# Altium footprint library SparkFun-Retired.PCBLIB: 302 footprints (part 10 of 19)
Each footprint in its own frame and in the unit in brackets; x right, y up, seen from the top. Pads: shape width x height; smd on the part's side, far side on the other; paste and mask are expansions set on the pad; w line width, h text height; cw(c..) or ccw(c..) is an arc to the next point about the centre after c.
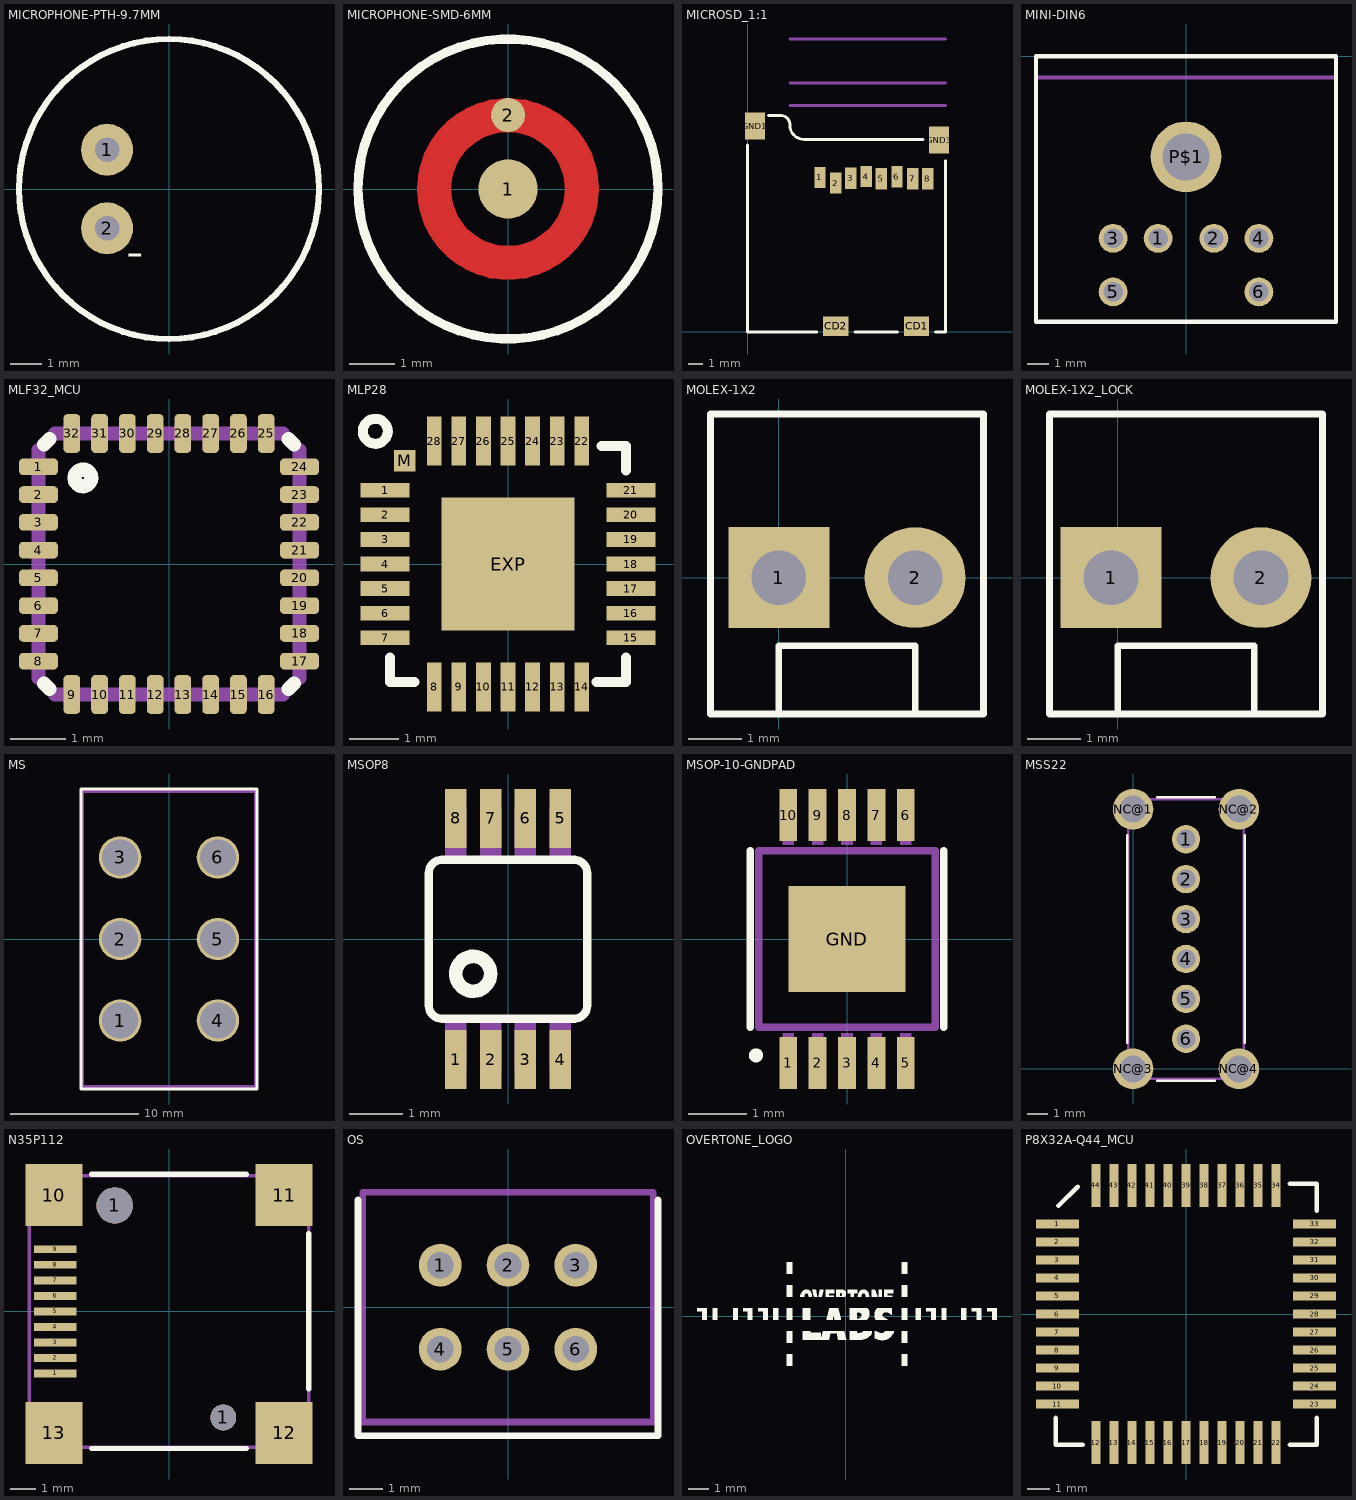
[diagram p9: the footprints below, top view; thin cyan lines are the x and y axes]

## MICROPHONE-PTH-9.7MM [mil]
pads (2):
  round 66 hole 31.5: 1(-78.74,50) 2(-78.74,-50)
Top Overlay:
  circle w8: c0,0 r190.94
  text "-" at -54.57,-115.35 h77.5
Bottom Overlay:
  text "-" at -20.24,-115.35 h77.5

## MICROPHONE-SMD-6MM [mil]
pads (2):
  rrect100% 51.18x51.18 smd: 1(0,0)
  rrect100% 29.53x29.53 smd: 2(0.12,64.03)
Top Layer:
  circle w29.53: c0,0 r63.98
Top Overlay:
  circle w8: c0,0 r129.92
Top Paste:
  circle w12: c0,0 r64.26
  circle w16: c0,0 r6.01
Top Solder:
  circle w38: c0,0 r64.07

## MICROSD_1:1 [mil]
pads (12):
  rect 31.5x59.06 smd: 1(200.62,429.89) 2(244.79,414.15) 3(286.37,427.3) 4(329.39,432.37) 5(370.9,426.3) 6(414.93,432.01) 7(458.59,425.94) 8(500.82,425.94)
  rect 70.87x55.12 smd: CD1(469.29,15.75) CD2(244.88,15.75)
  rect 55.12x74.8 smd: GND1(19.57,572.83) GND3(532.28,533.46)
Top Overlay:
  lines w8: -1.18,519.69 -1.18,0 191.73,0 ; 57.87,602.36 89.37,602.36 cw(c91.34,576.77) 116.93,574.8 ccw(c157.28,575.78) 156.3,535.43 487.01,535.43 ; 298.03,0 416.14,0 ; 522.44,0 550,0 550,476.38
Mechanical 16:
  lines w8: 116.93,629.92 550,629.92 ; 116.93,692.91 550,692.91 ; 116.93,814.96 550,814.96

## MINI-DIN6 [mm]
pads (7):
  round 1.35 hole 0.9: 1(-1.3,-8.5) 2(1.3,-8.5) 3(-3.4,-8.5) 4(3.4,-8.5) 5(-3.4,-11) 6(3.4,-11)
  round 3.3 hole 2.2: P$1(0,-4.7)
Top Overlay:
  lines w0.203: -7,-12.4 -7,0 7,0 7,-12.4 -7,-12.4
Mechanical 16:
  lines w0.203: -7,-1 7,-1

## MLF32_MCU [mm]
pads (32):
  rrect50% 0.7x0.3 smd: 1(-2.35,1.75) 2(-2.35,1.25) 3(-2.35,0.75) 4(-2.35,0.25) 5(-2.35,-0.25) 6(-2.35,-0.75) 7(-2.35,-1.25) 8(-2.35,-1.75) 17(2.35,-1.75) 18(2.35,-1.25) 19(2.35,-0.75) 20(2.35,-0.25) 21(2.35,0.25) 22(2.35,0.75) 23(2.35,1.25) 24(2.35,1.75)
  rrect50% 0.3x0.7 smd: 9(-1.75,-2.35) 10(-1.25,-2.35) 11(-0.75,-2.35) 12(-0.25,-2.35) 13(0.25,-2.35) 14(0.75,-2.35) 15(1.25,-2.35) 16(1.75,-2.35) 25(1.75,2.35) 26(1.25,2.35) 27(0.75,2.35) 28(0.25,2.35) 29(-0.25,2.35) 30(-0.75,2.35) 31(-1.25,2.35) 32(-1.75,2.35)
Top Overlay:
  circle w0.254: c-1.55,1.55 r0.15
  lines w0.254: -2.25,-2.15 -2.15,-2.25 ; -2.25,2.15 -2.15,2.25 ; 2.15,-2.25 2.25,-2.15 ; 2.15,2.25 2.25,2.15
Mechanical 16:
  rectangle: -2.5,1.6 -2.05,1.9
  rectangle: -2.5,1.1 -2.05,1.4
  rectangle: -2.5,0.6 -2.05,0.9
  rectangle: -2.5,0.1 -2.05,0.4
  rectangle: -2.5,-0.4 -2.05,-0.1
  rectangle: -2.5,-0.9 -2.05,-0.6
  rectangle: -2.5,-1.4 -2.05,-1.1
  rectangle: -2.5,-1.9 -2.05,-1.6
  rectangle: -1.9,-2.5 -1.6,-2.05
  rectangle: -1.4,-2.5 -1.1,-2.05
  rectangle: -0.9,-2.5 -0.6,-2.05
  rectangle: -0.4,-2.5 -0.1,-2.05
  rectangle: 0.1,-2.5 0.4,-2.05
  rectangle: 0.6,-2.5 0.9,-2.05
  rectangle: 1.1,-2.5 1.4,-2.05
  rectangle: 1.6,-2.5 1.9,-2.05
  rectangle: 2.05,-1.9 2.5,-1.6
  rectangle: 2.05,-1.4 2.5,-1.1
  rectangle: 2.05,-0.9 2.5,-0.6
  rectangle: 2.05,-0.4 2.5,-0.1
  rectangle: 2.05,0.1 2.5,0.4
  rectangle: 2.05,0.6 2.5,0.9
  rectangle: 2.05,1.1 2.5,1.4
  rectangle: 2.05,1.6 2.5,1.9
  rectangle: 1.6,2.05 1.9,2.5
  rectangle: 1.1,2.05 1.4,2.5
  rectangle: 0.6,2.05 0.9,2.5
  rectangle: 0.1,2.05 0.4,2.5
  rectangle: -0.4,2.05 -0.1,2.5
  rectangle: -0.9,2.05 -0.6,2.5
  rectangle: -1.4,2.05 -1.1,2.5
  rectangle: -1.9,2.05 -1.6,2.5
  lines w0.254: -2.35,-2.05 -2.35,2.05 ; -2.05,-2.35 2.05,-2.35 ; -2.05,2.35 2.05,2.35 ; 2.35,-2.05 2.35,2.05

## MLP28 [mm]
pads (30):
  rect 1x0.3 smd: 1(-2.5,1.5) 2(-2.5,1) 3(-2.5,0.5) 4(-2.5,0) 5(-2.5,-0.5) 6(-2.5,-1) 7(-2.5,-1.5) 15(2.5,-1.5) 16(2.5,-1) 17(2.5,-0.5) 18(2.5,0) 19(2.5,0.5) 20(2.5,1) 21(2.5,1.5)
  rect 0.3x1 smd: 8(-1.5,-2.5) 9(-1,-2.5) 10(-0.5,-2.5) 11(0,-2.5) 12(0.5,-2.5) 13(1,-2.5) 14(1.5,-2.5) 22(1.5,2.5) 23(1,2.5) 24(0.5,2.5) 25(0,2.5) 26(-0.5,2.5) 27(-1,2.5) 28(-1.5,2.5)
  rect 2.7x2.7 smd: EXP(0,0)
  rect 0.435x0.435 smd: M(-2.103,2.103)
Top Overlay:
  circle w0.203: c-2.699,2.699 r0.254
  lines w0.203: -2.4,-1.9 -2.4,-2.4 -1.9,-2.4 ; 1.8,-2.4 2.4,-2.4 2.4,-1.9 ; 1.9,2.4 2.4,2.4 2.4,1.9
Top Paste:
  rectangle: -2.58,1.37 -2.02,1.63
  rectangle: -0.5,-0.5 0.5,0.5
  rectangle: -2.25,1.95 -1.95,2.25
  rectangle: -2.58,0.87 -2.02,1.13
  rectangle: -2.58,0.37 -2.02,0.63
  rectangle: -2.58,-0.13 -2.02,0.13
  rectangle: -2.58,-0.63 -2.02,-0.37
  rectangle: -2.58,-1.13 -2.02,-0.87
  rectangle: -2.58,-1.63 -2.02,-1.37
  region: 1.37,2.58 1.37,2.02 1.63,2.02 1.63,2.58
  region: 0.87,2.58 0.87,2.02 1.13,2.02 1.13,2.58
  region: 0.37,2.58 0.37,2.02 0.63,2.02 0.63,2.58
  region: -0.13,2.58 -0.13,2.02 0.13,2.02 0.13,2.58
  region: -0.63,2.58 -0.63,2.02 -0.37,2.02 -0.37,2.58
  region: -1.13,2.58 -1.13,2.02 -0.87,2.02 -0.87,2.58
  region: -1.63,2.58 -1.63,2.02 -1.37,2.02 -1.37,2.58
  region: -1.37,-2.58 -1.37,-2.02 -1.63,-2.02 -1.63,-2.58
  region: -0.87,-2.58 -0.87,-2.02 -1.13,-2.02 -1.13,-2.58
  region: -0.37,-2.58 -0.37,-2.02 -0.63,-2.02 -0.63,-2.58
  region: 0.13,-2.58 0.13,-2.02 -0.13,-2.02 -0.13,-2.58
  region: 0.63,-2.58 0.63,-2.02 0.37,-2.02 0.37,-2.58
  region: 1.13,-2.58 1.13,-2.02 0.87,-2.02 0.87,-2.58
  region: 1.63,-2.58 1.63,-2.02 1.37,-2.02 1.37,-2.58
  region: 2.58,-1.37 2.02,-1.37 2.02,-1.63 2.58,-1.63
  region: 2.58,-0.87 2.02,-0.87 2.02,-1.13 2.58,-1.13
  region: 2.58,-0.37 2.02,-0.37 2.02,-0.63 2.58,-0.63
  region: 2.58,0.13 2.02,0.13 2.02,-0.13 2.58,-0.13
  region: 2.58,0.63 2.02,0.63 2.02,0.37 2.58,0.37
  region: 2.58,1.13 2.02,1.13 2.02,0.87 2.58,0.87
  region: 2.58,1.63 2.02,1.63 2.02,1.37 2.58,1.37
Top Solder:
  rectangle: -3.05,1.3 -2,1.7
  rectangle: -2.353,1.852 -1.852,2.353
  rectangle: -3.05,0.8 -2,1.2
  rectangle: -1.5,-1.5 1.5,1.5
  rectangle: -3.05,0.3 -2,0.7
  rectangle: -3.05,-0.2 -2,0.2
  rectangle: -3.05,-0.7 -2,-0.3
  rectangle: -3.05,-1.2 -2,-0.8
  rectangle: -3.05,-1.7 -2,-1.3
  region: 1.3,3.05 1.3,2 1.7,2 1.7,3.05
  region: 0.8,3.05 0.8,2 1.2,2 1.2,3.05
  region: 0.3,3.05 0.3,2 0.7,2 0.7,3.05
  region: -0.2,3.05 -0.2,2 0.2,2 0.2,3.05
  region: -0.7,3.05 -0.7,2 -0.3,2 -0.3,3.05
  region: -1.2,3.05 -1.2,2 -0.8,2 -0.8,3.05
  region: -1.7,3.05 -1.7,2 -1.3,2 -1.3,3.05
  region: -1.3,-3.05 -1.3,-2 -1.7,-2 -1.7,-3.05
  region: -0.8,-3.05 -0.8,-2 -1.2,-2 -1.2,-3.05
  region: -0.3,-3.05 -0.3,-2 -0.7,-2 -0.7,-3.05
  region: 0.2,-3.05 0.2,-2 -0.2,-2 -0.2,-3.05
  region: 0.7,-3.05 0.7,-2 0.3,-2 0.3,-3.05
  region: 1.2,-3.05 1.2,-2 0.8,-2 0.8,-3.05
  region: 1.7,-3.05 1.7,-2 1.3,-2 1.3,-3.05
  region: 3.05,-1.3 2,-1.3 2,-1.7 3.05,-1.7
  region: 3.05,-0.8 2,-0.8 2,-1.2 3.05,-1.2
  region: 3.05,-0.3 2,-0.3 2,-0.7 3.05,-0.7
  region: 3.05,0.2 2,0.2 2,-0.2 3.05,-0.2
  region: 3.05,0.7 2,0.7 2,0.3 3.05,0.3
  region: 3.05,1.2 2,1.2 2,0.8 3.05,0.8
  region: 3.05,1.7 2,1.7 2,1.3 3.05,1.3

## MOLEX-1X2 [mil]
pads (2):
  rect 74x74 hole 40: 1(0,0)
  round 74 hole 40: 2(100,0)
Top Overlay:
  lines w5: 0,-100 100,-100 ; 0,-100 -50,-100 -50,120 150,120 150,-100 100,-100 ; 0,-100 0,-50 100,-50 100,-100

## MOLEX-1X2_LOCK [mil]
pads (2):
  rect 74x74 hole 40: 1(-5,0)
  round 74 hole 40: 2(105,0)
Top Overlay:
  lines w5: 0,-100 100,-100 ; 0,-100 -50,-100 -50,120 150,120 150,-100 100,-100 ; 0,-100 0,-50 100,-50 100,-100
Mechanical 16:
  rectangle: -11.5,-11.5 11.5,11.5
  rectangle: 88.5,-11.5 111.5,11.5

## MS [mil]
pads (6):
  round 130 hole 110.24: 1(-150,-250) 2(-150,0) 3(-150,250) 4(150,-250) 5(150,0) 6(150,250)
Top Overlay:
  lines w8: -270,-460 -270,460 270,460 270,-460 -270,-460
Mechanical 16:
  lines w8: -265,-452.5 265,-452.5 265,452.5 -265,452.5 -265,-452.5

## MSOP8 [mil]
pads (8):
  rect 15.75x43.31 smd: 1(-38.39,-88.58) 2(-12.8,-88.58) 3(12.8,-88.58) 4(38.39,-88.58) 5(38.39,88.58) 6(12.8,88.58) 7(-12.8,88.58) 8(-38.39,88.58)
Top Overlay:
  circle w10: c-25.59,-25.59 r12.8
  lines w6: -58.27,-48.82 ccw(c-48.43,-48.82) -48.43,-58.66 ; -58.27,-48.43 -58.27,48.43 cw(c-48.43,48.43) -48.43,58.27 ; -48.03,-58.66 48.82,-58.66 ; -48.03,58.27 48.82,58.27 ; 48.43,-58.66 ccw(c48.43,-48.82) 58.27,-48.82 58.27,48.43 ccw(c48.43,48.43) 48.43,58.27
Mechanical 16:
  rectangle: -46.26,-96.46 -30.51,-61.02
  rectangle: -20.67,-96.46 -4.92,-61.02
  rectangle: 4.92,-96.46 20.67,-61.02
  rectangle: 30.51,-96.46 46.26,-61.02
  rectangle: 30.51,61.02 46.26,96.46
  rectangle: 4.92,61.02 20.67,96.46
  rectangle: -20.67,61.02 -4.92,96.46
  rectangle: -46.26,61.02 -30.51,96.46

## MSOP-10-GNDPAD [mil]
pads (11):
  rect 12.01x35 smd: 1(-39.37,-83.05) 2(-19.69,-83.05) 3(0,-83.05) 4(19.69,-83.05) 5(39.37,-83.05) 6(39.37,83.05) 7(19.69,83.05) 8(0,83.05) 9(-19.69,83.05) 10(-39.37,83.05)
  rect 78.74x70.87 smd: GND(0,0)
Top Overlay:
  circle w5: c-61,-78 r2.23
  lines w5: -64.99,-59.06 -64.99,59.06 ; 64.99,-59.06 64.99,59.06
Top Paste:
  rectangle: -19.69,-19.69 19.69,19.69
Mechanical 16:
  rectangle: -43.31,62.99 -35.43,96.46
  rectangle: -23.62,62.99 -15.75,96.46
  rectangle: -3.94,62.99 3.94,96.46
  rectangle: 15.75,62.99 23.62,96.46
  rectangle: 35.43,62.99 43.31,96.46
  rectangle: -43.31,-96.46 -35.43,-62.99
  rectangle: -23.62,-96.46 -15.75,-62.99
  rectangle: -3.94,-96.46 3.94,-62.99
  rectangle: 15.75,-96.46 23.62,-62.99
  rectangle: 35.43,-96.46 43.31,-62.99
  lines w5: -59.06,-59.06 -59.06,59.06 59.06,59.06 59.06,-59.06 -59.06,-59.06

## MSS22 [mm]
pads (10):
  round 1.425 hole 0.95: 1(2.65,11.5) 2(2.65,9.5) 3(2.65,7.5) 4(2.65,5.5) 5(2.65,3.5) 6(2.65,1.5)
  round 2.025 hole 1.35: NC@1(0,13) NC@2(5.3,13) NC@3(0,0) NC@4(5.3,0)
Top Overlay:
  lines w0.127: -0.3,1.3 -0.3,11.7 ; 1.2,-0.6 4.1,-0.6 ; 1.2,13.6 4.1,13.6 ; 5.6,1.3 5.6,11.7
Mechanical 16:
  lines w0.127: -0.25,-0.5 5.55,-0.5 5.55,13.5 -0.25,13.5 -0.25,-0.5

## N35P112 [mm]
pads (15):
  rect 1.65x0.3 smd: 1(-4.4,-2.4) 2(-4.4,-1.8) 3(-4.4,-1.2) 4(-4.4,-0.6) 5(-4.4,0) 6(-4.4,0.6) 7(-4.4,1.2) 8(-4.4,1.8) 9(-4.4,2.4)
  round 1.4 hole 1.4: 1(-2.1,4.1)
  round 1 hole 1: 1(2.1,-4.1)
  rect 2.2x2.4 smd: 10(-4.45,4.5) 11(4.45,4.5) 12(4.45,-4.7) 13(-4.45,-4.7)
Top Overlay:
  lines w0.203: -3,-5.3 3,-5.3 ; -3,5.3 3,5.3 ; 5.4,-3 5.4,3
Mechanical 16:
  lines w0.127: -5.4,-5.25 5.4,-5.25 5.4,5.25 -5.4,5.25 -5.4,-5.25

## OS [mil]
pads (6):
  round 50 hole 31: 1(-79,49) 2(0,49) 3(79,49) 4(-79,-49) 5(0,-49) 6(79,-49)
Top Overlay:
  lines w8: -175,125 -175,-150 175,-150 175,125
Mechanical 16:
  lines w8: -169.5,-134 169.5,-134 169.5,134 -169.5,134 -169.5,-134

## OVERTONE_LOGO [mil]
Top Overlay:
  drawing of 1667 lines, arcs and shapes, not listed

## P8X32A-Q44_MCU [mil]
pads (44):
  rect 74.8x15.75 smd: 1(-224.9,157.97) 2(-224.9,126.48) 3(-224.9,94.98) 4(-224.9,63.48) 5(-224.9,31.99) 6(-224.9,0.49) 7(-224.9,-31) 8(-224.9,-62.5) 9(-224.9,-94) 10(-224.9,-125.49) 11(-224.9,-156.99) 23(223.92,-156.99) 24(223.92,-125.49) 25(223.92,-94) 26(223.92,-62.5) 27(223.92,-31) 28(223.92,0.49) 29(223.92,31.99) 30(223.92,63.48) 31(223.92,94.98) 32(223.92,126.48) 33(223.92,157.97)
  rect 15.75x74.8 smd: 12(-157.97,-223.92) 13(-126.48,-223.92) 14(-94.98,-223.92) 15(-63.48,-223.92) 16(-31.99,-223.92) 17(-0.49,-223.92) 18(31,-223.92) 19(62.5,-223.92) 20(94,-223.92) 21(125.49,-223.92) 22(156.99,-223.92) 34(156.99,224.9) 35(125.49,224.9) 36(94,224.9) 37(62.5,224.9) 38(31,224.9) 39(-0.49,224.9) 40(-31.99,224.9) 41(-63.48,224.9) 42(-94.98,224.9) 43(-126.48,224.9) 44(-157.97,224.9)
Top Overlay:
  lines w8: -228,-181 -228,-228 -181,-228 ; -222.99,189.12 -189.76,222.36 ; 181,-228 228,-228 228,-181 ; 181,228 228,228 228,181